# Altium schematic symbol library JL_SCH.SchLib: 1185 symbols (part 3 of 6) (continued)
## Header 30X2_2 (continued)
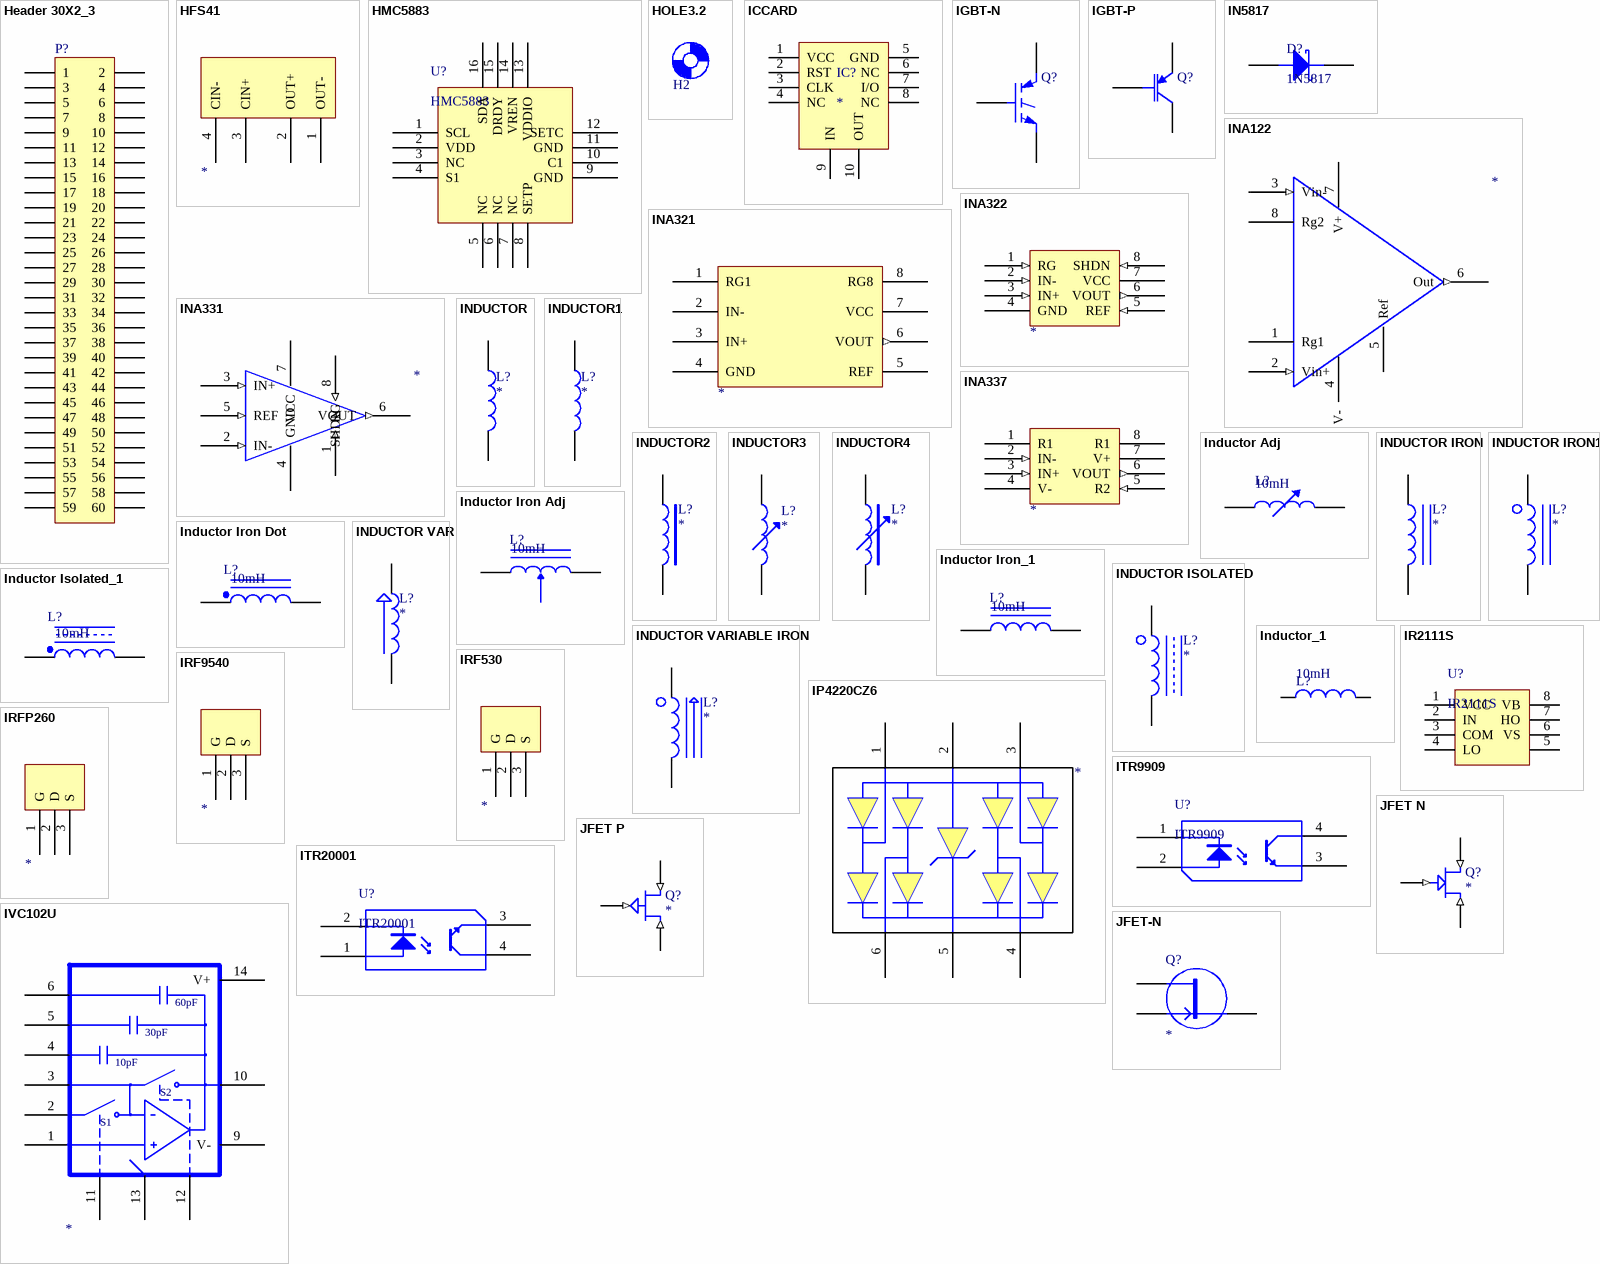
[diagram p18: symbols Header 30X2_3 to JFET-N]

## Header 30X2_3
designator P?
Header, 30-Pin, Dual row; LatestRevisionDate: 17-Jul-2002; LatestRevisionNote: Re-released for DXP Platform.; Publisher: Altium Limited
footprint HDR2X30 (Connector; Header; 30x2 Position)
pins: 1, 2, 3, 4, 5, 6, 7, 8, 9, 10, 11, 12, 13, 14, 15, 16, 17, 18, 19, 20, 21, 22, 23, 24, 25, 26, 27, 28, 29, 30, 31, 32, 33, 34, 35, 36, 37, 38, 39, 40, 41, 42, 43, 44, 45, 46, 47, 48, 49, 50, 51, 52, 53, 54, 55, 56, 57, 58, 59, 60

## HFS41
designator ?
pins: 1 OUT-, 2 OUT+, 3 CIN+, 4 CIN-

## HMC5883
designator U?
footprint LPCC-16 (Footprint not found)
pins: 1 SCL, 2 VDD, 3 NC, 4 S1, 5 NC, 6 NC, 7 NC, 8 SETP, 9 GND, 10 C1, 11 GND, 12 SETC, 13 VDDIO, 14 VREN, 15 DRDY, 16 SDA

## HOLE3.2
designator H2, comment Comment  (value not drawn)
footprint HOLE3.2

## ICCARD
designator IC?
footprint ICCARD (IC?)
pins: 1 VCC, 2 RST, 3 CLK, 4 NC, 5 GND, 6 NC, 7 I/O, 8 NC, 9 IN, 10 OUT

## IGBT-N
designator Q?
Insulated Gate Bipolar Transistor (N-Channel); Published: 8-Jun-2000; LatestRevisionDate: 17-Jul-2002; LatestRevisionNote: Re-released for DXP Platform.; DatasheetVersion: PD-9.684A; PackageReference: TO-247; Publisher: Altium Limited; Code_JEDEC: TO-247-AC; ComponentLink1Description: Manufacturer Link; ComponentLink1URL: http://www.irf.com/
footprint SFM-F3/Y2.3 (SIP with Mounting Hole; 3 Leads; Body 20 x 15.6 x 5 mm (typ); Pitch 5.45 mm)
simulation model IRGPC40U (Spice Subcircuit)
pins: 1 G, 2 C, 3 E

## IGBT-P
designator Q?
PNP Bipolar Junction Transistor; Published: 8-Jun-2000; LatestRevisionDate: 17-Jul-2002; LatestRevisionNote: Re-released for DXP Platform.; PackageReference: TO-264-AA; Publisher: Altium Limited; Code_JEDEC: TO-264-AA
footprint SFM-F3/B1.5 (SIP with Mounting Hole; 3 Leads; Body 26 x 20 x 5 mm (typ); Pitch 5.45 mm)
simulation model PIGBT (Spice Subcircuit)
pins: 1 C, 2 G, 3 E

## IN5817
designator D?, comment 1N5817
footprint TO-92 (TO, Flat Index; 3 In-Line, Axial Leads; Body Dia. 5.1mm; Leads 0.48 x 0.48 mm (max))
pins: 1 A, 2 K

## INA122
designator ?
pins: 1 Rg1, 2 Vin+ (in), 3 Vin- (in), 4 V- (power), 5 Ref, 6 Out (out), 7 V+ (power), 8 Rg2

## INA321
designator ?
pins: 1 RG1, 2 IN-, 3 IN+, 4 GND (power), 5 REF, 6 VOUT (out), 7 VCC (power), 8 RG8

## INA322
designator ?
pins: 1 RG (in), 2 IN- (in), 3 IN+ (in), 4 GND (power), 5 REF (in), 6 VOUT (out), 7 VCC (power), 8 SHDN (in)

## INA331
designator ?
pins: 1 RG (in), 2 IN- (in), 3 IN+ (in), 4 GND (power), 5 REF (in), 6 VOUT (out), 7 VCC (power), 8 SHDN (in)

## INA337
designator ?
pins: 1 R1, 2 IN- (in), 3 IN+ (in), 4 V- (power), 5 R2 (in), 6 VOUT (out), 7 V+ (power), 8 R1

## INDUCTOR
designator L?
Value: 100uH
footprint CD75
pins: 1, 2

## INDUCTOR1
designator L?
pins: 1, 2

## INDUCTOR2
designator L?
pins: 1, 2

## INDUCTOR3
designator L?
pins: 1, 2

## INDUCTOR4
designator L?
pins: 1, 2

## Inductor Adj
designator L?  value 10mH
Adjustable Inductor; Set Position: 0.5; Published: 24-Mar-1999; LatestRevisionDate: 17-Jul-2002; LatestRevisionNote: Re-released for DXP Platform.; PackageReference: AXIAL-0.8; Publisher: Altium Limited
footprint AXIAL-0.8 (Axial Device, Thru-Hole; 2 Leads; 0.8 in Pin Spacing)
simulation model INDUCTOR (Inductor)
signal-integrity model Inductor Adj
pins: 1, 2

## INDUCTOR IRON
designator L?
pins: 1, 2

## INDUCTOR IRON1
designator L?
pins: 1, 2

## Inductor Iron Adj
designator L?  value 10mH
Adjustable Magnetic-Core Inductor; Set Position: 0.5; Published: 24-Mar-1999; LatestRevisionDate: 17-Jul-2002; LatestRevisionNote: Re-released for DXP Platform.; PackageReference: AXIAL-1.0; Publisher: Altium Limited
footprint AXIAL-1.0 (Axial Device, Thru-Hole; 2 Leads; 1.0 in Pin Spacing)
simulation model INDUCTOR (Inductor)
signal-integrity model Inductor Iron Adj
pins: 1, 2

## Inductor Iron Dot
designator L?  value 10mH
Magnetic-Core Inductor with Winding Polarity Marking; Published: 24-Mar-1999; LatestRevisionDate: 17-Jul-2002; LatestRevisionNote: Re-released for DXP Platform.; PackageReference: DIODE_SMC; Publisher: Altium Limited
footprint DIODE_SMC (Magnetic-Core Inductor with Winding Polarity Marking; 2 Leads)
signal-integrity model Inductor Iron Dot
pins: 1, 2

## Inductor Iron_1
designator L?  value 10mH
Magnetic-Core Inductor; Published: 24-Mar-1999; LatestRevisionDate: 17-Jul-2002; LatestRevisionNote: Re-released for DXP Platform.; PackageReference: AXIAL-0.9; Publisher: Altium Limited
footprint AXIAL-0.9 (Axial Device, Thru-Hole; 2 Leads; 0.9 in Pin Spacing)
simulation model INDUCTOR (Inductor)
signal-integrity model Inductor Iron
pins: 1, 2

## INDUCTOR ISOLATED
designator L?
pins: 1, 2

## Inductor Isolated_1
designator L?  value 10mH
Isolated Inductor; Published: 24-Mar-1999; LatestRevisionDate: 17-Jul-2002; LatestRevisionNote: Re-released for DXP Platform.; PackageVersion: 1988; PackageReference: 425; Publisher: Altium Limited
footprint SOD123/X.85 (SOD-123; 2 Leads; Body 2.7 x 1.6 mm, (LxW))
signal-integrity model Inductor Isolated
pins: 1, 2

## INDUCTOR VAR
designator L?
pins: 1, 2

## INDUCTOR VARIABLE IRON
designator L?
pins: 1, 2

## Inductor_1
designator L?  value 10mH
Inductor; Code_IEC: 1005; Published: 8-Jun-2000; LatestRevisionDate: 29-May-2009; LatestRevisionNote: IPC-7351 Footprint Added.; PackageReference: 0402-A; Publisher: Altium Limited; PackageDescription: Chip Inductor; Code_JEITA: 0402
footprint INDC1005AL (Chip Inductor, Body 1.0x0.5mm, IPC High Density)
footprint INDC1608L (Chip Inductor, Body 1.6x0.8mm, IPC High Density)
footprint INDC2012L (Chip Inductor, Body 2.0x1.2mm, IPC High Density)
footprint INDC0603L (Chip Inductor, Body 0.6x0.3mm, IPC High Density)
footprint INDC3216AL (Chip Inductor, Body 3.2x1.6mm, IPC High Density)
footprint INDC4532L (Chip Inductor, Body 4.5x3.2mm, IPC High Density)
simulation model INDUCTOR (Inductor)
signal-integrity model Inductor
pins: 1, 2

## IP4220CZ6
designator ?
pins: 1 D1, 2 V-, 3 D2, 4 D3, 5 V+, 6 D4

## IR2111S
designator U?
footprint SOIC8
footprint DIP8
pins: 1 VCC, 2 IN, 3 COM, 4 LO, 5, 6 VS, 7 HO, 8 VB

## IRF530
designator ?
pins: 1 G, 2 D, 3 S

## IRF9540
designator ?
pins: 1 G, 2 D, 3 S

## IRFP260
designator ?
pins: 1 G, 2 D, 3 S

## ITR9909
designator U?
footprint ITR9909
pins: 1, 2, 3, 4

## ITR20001
designator U?
footprint ITR20001
pins: 1, 2, 3, 4

## IVC102U
designator ?
IVC102U
pins: 1, 2, 3, 4, 5 11, 6 12, 9 V-, 10, 11, 12 14, 13 17, 14 V+
text: 60pF; 30pF; 10pF; S2; S1

## JFET N
designator Q?
pins: 1 G (in), 2 D (in), 3 S (in)

## JFET P
designator Q?
pins: 1 G (in), 2 D (in), 3 S (in)

## JFET-N
designator Q?
pins: 1 D, 2 G, 3 S

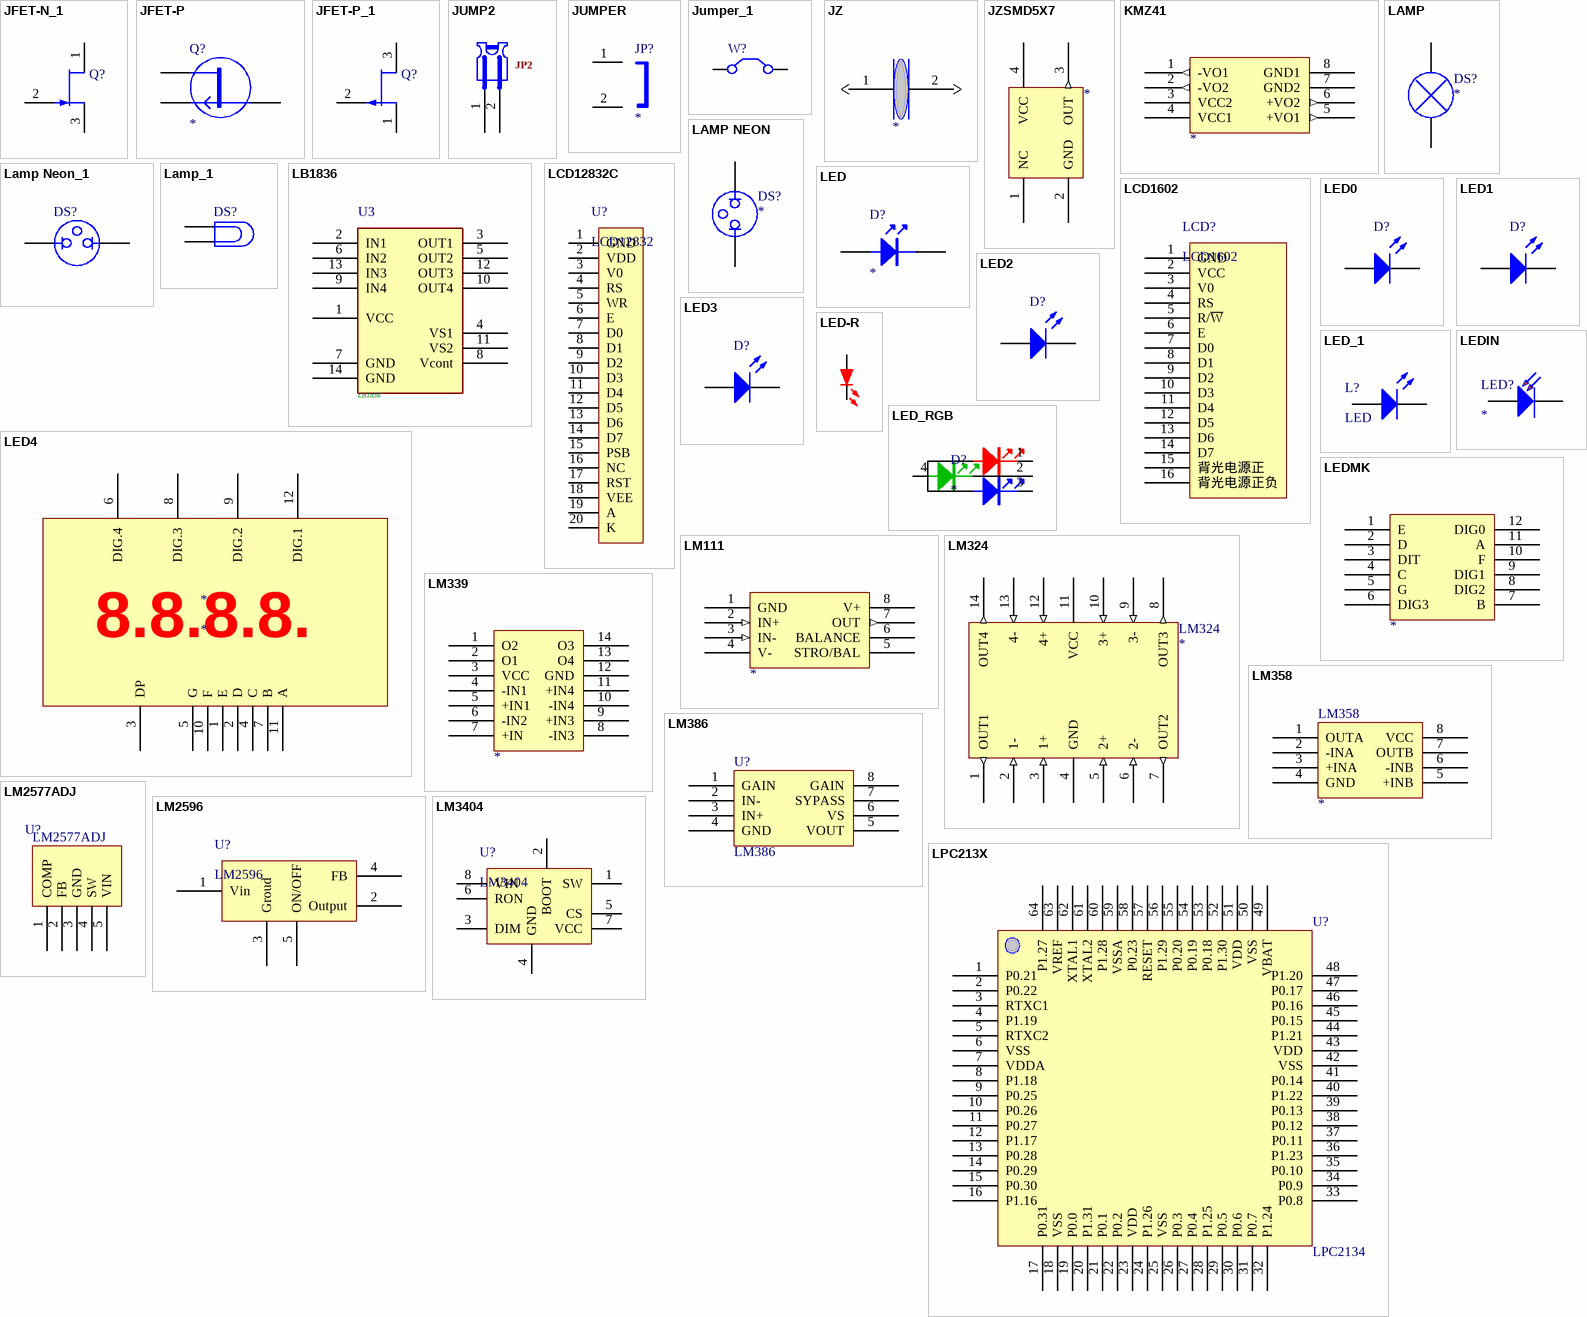
[diagram p19: symbols JFET-N_1 to LPC213X]

## JFET-N_1
designator Q?
N-Channel JFET; Published: 8-Jun-2000; LatestRevisionDate: 17-Jul-2002; LatestRevisionNote: Re-released for DXP Platform.; PackageReference: TO-254-AA; Publisher: Altium Limited; Code_JEDEC: TO-254-AA
footprint SFM-T3/A6.6V (TO, Thru-Hole, Vertical, Heatsink Mounted; 3 In-Line Leads; Pitch 3.81 mm)
simulation model NJFET
pins: 1 D, 2 G, 3 S

## JFET-P
designator Q?
pins: 1 D, 2 G, 3 S

## JFET-P_1
designator Q?
P-Channel JFET; Published: 8-Jun-2000; LatestRevisionDate: 17-Jul-2002; LatestRevisionNote: Re-released for DXP Platform.; PackageReference: TO-18A; Publisher: Altium Limited
footprint SO-F3/Y.75R (SC-89; 3 Flat Leads; Body 1.6 x 1.6 x 0.7 mm, inc leads (LxWxH typ))
simulation model PJFET
pins: 1 D, 2 G, 3 S

## JUMP2
designator JP2, comment JUMP  (value not drawn)
footprint HDR1X2 (Connector; Header; 2 Position)
pins: 1, 2

## JUMPER
designator JP?
Jumper
footprint RAD0.2
pins: 1, 2

## Jumper_1
designator W?
Jumper Wire; Published: 24-Mar-1999; LatestRevisionDate: 17-Jul-2002; LatestRevisionNote: Re-released for DXP Platform.; PackageReference: RAD-0.2; Publisher: Altium Limited
footprint RAD-0.2 (Radial Cap, Thru-Hole; 2 Leads; 0.2 in Pin Spacing)
pins: 1 C1, 2 C2

## JZ
designator ?
pins: 1 (hiz), 2 (hiz)

## JZSMD5X7
designator ?
pins: 1 NC, 2 GND (power), 3 OUT (out), 4 VCC (power)

## KMZ41
designator ?
pins: 1 -VO1 (out), 2 -VO2 (out), 3 VCC2 (power), 4 VCC1 (power), 5 +VO1 (out), 6 +VO2 (out), 7 GND2 (power), 8 GND1 (power)

## LAMP
designator DS?
pins: 1, 2

## LAMP NEON
designator DS?
pins: 1, 2

## Lamp Neon_1
designator DS?
Neon Lamp; Published: 24-Mar-1999; LatestRevisionDate: 17-Jul-2002; LatestRevisionNote: Re-released for DXP Platform.; PackageReference: PIN2; Publisher: Altium Limited
footprint PIN2 (Neon Lamp; 2 Leads)
pins: 1, 2

## Lamp_1
designator DS?
Incandescent Bulb; Published: 24-Mar-1999; LatestRevisionDate: 17-Jul-2002; LatestRevisionNote: Re-released for DXP Platform.; PackageReference: PIN2; Publisher: Altium Limited
footprint PIN2 (Incandescent Bulb; 2 Leads)
pins: 1, 2

## LB1836
designator U3
footprint SOP14-225-1.27
pins: 1 VCC, 2 IN1, 3 OUT1, 4 VS1, 5 OUT2, 6 IN2, 7 GND, 8 Vcont, 9 IN4, 10 OUT4, 11 VS2, 12 OUT3, 13 IN3, 14 GND

## LCD1602
designator LCD?
footprint LCD1602A (LCD1602A液晶显示器)
pins: 1 GND, 2 VCC, 3 V0, 4 RS, 5 R/~{W}, 6 E, 7 D0, 8 D1, 9 D2, 10 D3, 11 D4, 12 D5, 13 D6, 14 D7, 15 背光电源正, 16 背光电源正负

## LCD12832C
designator U?, comment LCD12832
footprint HDR1X20 (Connector; Header; 20 Position)
pins: 1 GND, 2 VDD, 3 V0, 4 RS, 5 WR, 6 E, 7 D0, 8 D1, 9 D2, 10 D3, 11 D4, 12 D5, 13 D6, 14 D7, 15 PSB, 16 NC, 17 RST, 18 VEE, 19 A, 20 K

## LED
designator D?
footprint 0805D
pins: 1, 2

## LED0
designator D?
Typical INFRARED GaAs LED; Published: 8-Jun-2000; LatestRevisionDate: 08-Jul-2005; LatestRevisionNote: Mech Layer 1 removed.; PackageReference: LED-0; Publisher: Altium Limited
footprint LED-0 (Typical INFRARED GaAs LED; 2 Leads)
simulation model LED0 (Diode)
pins: 1 A, 2 K

## LED1
designator D?
Typical RED GaAs LED; Published: 8-Jun-2000; LatestRevisionDate: 08-Jul-2005; LatestRevisionNote: Mech Layer 1 removed.; PackageReference: LED-1; Publisher: Altium Limited
footprint LED-1 (Typical RED GaAs LED; 2 Leads)
simulation model LED1 (Diode)
pins: 1 A, 2 K

## LED2
designator D?
Typical RED, GREEN, YELLOW, AMBER GaAs LED; Published: 8-Jun-2000; LatestRevisionDate: 17-Jul-2002; LatestRevisionNote: Re-released for DXP Platform.; PackageVersion: Feb-2002; PackageReference: 3.2X1.6X1.1; Publisher: Altium Limited
footprint DSO-F2/D6.1 (SMT LED; 2 Flat Leads)
simulation model LED2 (Diode)
pins: 1 A, 2 K

## LED3
designator D?
Typical BLUE SiC LED; Published: 8-Jun-2000; LatestRevisionDate: 17-Dec-2003; LatestRevisionNote: PCB Footprint replaced.; DatasheetVersion: 16-Apr-2002; PackageVersion: 16-Apr-2002; PackageReference: 3.5X2.8X1.9; Publisher: Altium Limited
footprint DSO-C2/D5.6 (SM LED; 2 C-Bend Leads; Body 3.5 x 2.8 x 1.9 mm, inc leads (LxWxH typ))
simulation model LED3 (Diode)
signal-integrity model LED
pins: 1 A, 2 K

## LED4
designator *
footprint LED4
pins: 1 E, 2 D, 3 DP, 4 C, 5 G, 6 DIG.4, 7 B, 8 DIG.3, 9 DIG.2, 10 F, 11 A, 12 DIG.1
text: 8.8.8.8.

## LED-R
designator LED2  (value not drawn)
footprint 0805-d
footprint 0603-d
pins: 1 A, 2 K
2 alternate drawings of the same symbol

## LED_1
designator L?, comment LED
footprint C2012 (Chip Capacitor, 2-Leads, Body 2.0x1.2mm, IPC Low Density)
pins: 1 A, 2 K

## LED_RGB
designator D?
footprint LED3528
pins: 1, 2, 3, 4

## LEDIN
designator LED?
footprint led5mm
pins: 1, 2

## LEDMK
designator ?
pins: 1 E, 2 D, 3 DIT, 4 C, 5 G, 6 DIG3, 7 B, 8 DIG2, 9 DIG1, 10 F, 11 A, 12 DIG0

## LM111
designator ?
pins: 1 GND (power), 2 IN+ (in), 3 IN- (in), 4 V- (power), 5 STRO/BAL, 6 BALANCE, 7 OUT (out), 8 V+ (power)

## LM324
designator LM324
pins: 1 OUT1 (out), 2 1- (in), 3 1+ (in), 4 GND (power), 5 2+ (in), 6 2- (in), 7 OUT2 (out), 8 OUT3 (out), 9 3- (in), 10 3+ (in), 11 VCC (power), 12 4+ (in), 13 4- (in), 14 OUT4 (out)

## LM339
designator ?
pins: 1 O2, 2 O1, 3 VCC, 4 -IN1, 5 +IN1, 6 -IN2, 7 +IN, 8 -IN3, 9 +IN3, 10 -IN4, 11 +IN4, 12 GND, 13 O4, 14 O3

## LM358
designator LM358
footprint SO-8
pins: 1 OUTA, 2 -INA, 3 +INA, 4 GND, 5 +INB, 6 -INB, 7 OUTB, 8 VCC

## LM386
designator U?
footprint so-8
pins: 1 GAIN, 2 IN-, 3 IN+, 4 GND, 5 VOUT, 6 VS, 7 SYPASS, 8 GAIN

## LM2577ADJ
designator U?
Value: LM2577ADJ
footprint TO-263 (Footprint not found)
pins: 1 COMP, 2 FB, 3 GND, 4 SW, 5 VIN

## LM2596
designator U?
footprint TO-263-5
pins: 1 Vin, 2 Output, 3 Groud, 4 FB, 5 ON/OFF

## LM3404
designator U?
footprint SO-8 (Footprint not found)
pins: 1 SW, 2 BOOT, 3 DIM, 4 GND, 5 CS, 6 RON, 7 VCC, 8 VIN

## LPC213X
designator U?, comment LPC2134
LPC2131
footprint LQFP-64
pins: 1 P0.21, 2 P0.22, 3 RTXC1, 4 P1.19, 5 RTXC2, 6 VSS, 7 VDDA, 8 P1.18, 9 P0.25, 10 P0.26, 11 P0.27, 12 P1.17, 13 P0.28, 14 P0.29, 15 P0.30, 16 P1.16, 17 P0.31, 18 VSS, 19 P0.0, 20 P1.31, 21 P0.1, 22 P0.2, 23 VDD, 24 P1.26, 25 VSS, 26 P0.3, 27 P0.4, 28 P1.25, 29 P0.5, 30 P0.6, 31 P0.7, 32 P1.24, 33 P0.8, 34 P0.9, 35 P0.10, 36 P1.23, 37 P0.11, 38 P0.12, 39 P0.13, 40 P1.22, 41 P0.14, 42 VSS, 43 VDD, 44 P1.21, 45 P0.15, 46 P0.16, 47 P0.17, 48 P1.20, 49 VBAT, 50 VSS, 51 VDD, 52 P1.30, 53 P0.18, 54 P0.19, 55 P0.20, 56 P1.29, 57 RESET, 58 P0.23, 59 VSSA, 60 P1.28, 61 XTAL2, 62 XTAL1, 63 VREF, 64 P1.27

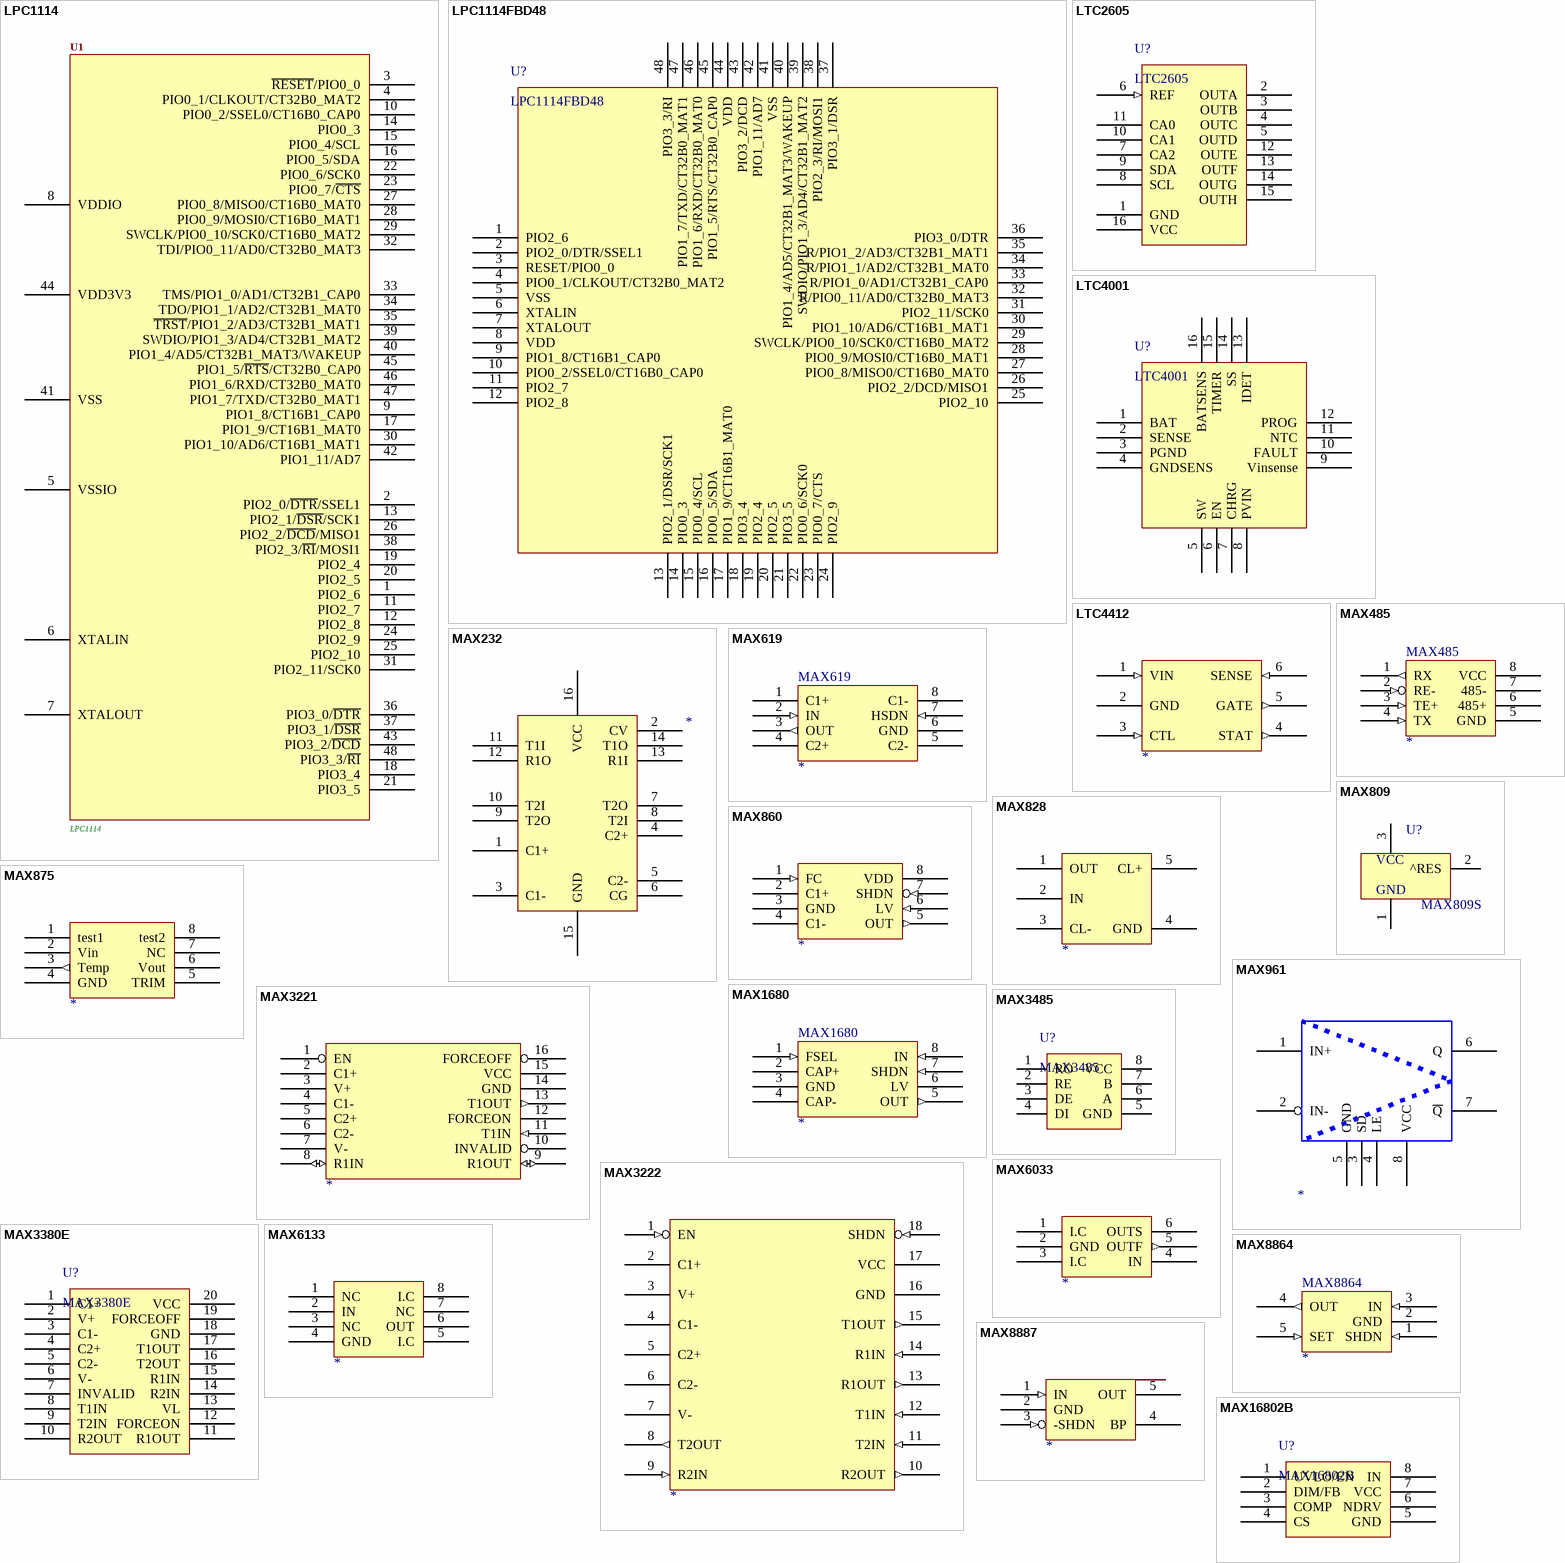
[diagram p20: symbols LPC1114 to MAX16802B]

## LPC1114
designator U1
footprint LQFP-48
pins: 1 PIO2_6, 2 PIO2_0/~{DTR}/SSEL1, 3 ~{RESET}/PIO0_0, 4 PIO0_1/CLKOUT/CT32B0_MAT2, 5 VSSIO, 6 XTALIN, 7 XTALOUT, 8 VDDIO, 9 PIO1_8/CT16B1_CAP0, 10 PIO0_2/SSEL0/CT16B0_CAP0, 11 PIO2_7, 12 PIO2_8, 13 PIO2_1/~{DSR}/SCK1, 14 PIO0_3, 15 PIO0_4/SCL, 16 PIO0_5/SDA, 17 PIO1_9/CT16B1_MAT0, 18 PIO3_4, 19 PIO2_4, 20 PIO2_5, 21 PIO3_5, 22 PIO0_6/SCK0, 23 PIO0_7/~{CTS}, 24 PIO2_9, 25 PIO2_10, 26 PIO2_2/~{DCD}/MISO1, 27 PIO0_8/MISO0/CT16B0_MAT0, 28 PIO0_9/MOSI0/CT16B0_MAT1, 29 SWCLK/PIO0_10/SCK0/CT16B0_MAT2, 30 PIO1_10/AD6/CT16B1_MAT1, 31 PIO2_11/SCK0, 32 TDI/PIO0_11/AD0/CT32B0_MAT3, 33 TMS/PIO1_0/AD1/CT32B1_CAP0, 34 TDO/PIO1_1/AD2/CT32B1_MAT0, 35 ~{TRST}/PIO1_2/AD3/CT32B1_MAT1, 36 PIO3_0/~{DTR}, 37 PIO3_1/~{DSR}, 38 PIO2_3/~{RI}/MOSI1, 39 SWDIO/PIO1_3/AD4/CT32B1_MAT2, 40 PIO1_4/AD5/CT32B1_MAT3/WAKEUP, 41 VSS, 42 PIO1_11/AD7, 43 PIO3_2/~{DCD}, 44 VDD3V3, 45 PIO1_5/~{RTS}/CT32B0_CAP0, 46 PIO1_6/RXD/CT32B0_MAT0, 47 PIO1_7/TXD/CT32B0_MAT1, 48 PIO3_3/~{RI}

## LPC1114FBD48
designator U?
footprint LQFP48
pins: 1 PIO2_6, 2 PIO2_0/DTR/SSEL1, 3 RESET/PIO0_0, 4 PIO0_1/CLKOUT/CT32B0_MAT2, 5 VSS, 6 XTALIN, 7 XTALOUT, 8 VDD, 9 PIO1_8/CT16B1_CAP0, 10 PIO0_2/SSEL0/CT16B0_CAP0, 11 PIO2_7, 12 PIO2_8, 13 PIO2_1/DSR/SCK1, 14 PIO0_3, 15 PIO0_4/SCL, 16 PIO0_5/SDA, 17 PIO1_9/CT16B1_MAT0, 18 PIO3_4, 19 PIO2_4, 20 PIO2_5, 21 PIO3_5, 22 PIO0_6/SCK0, 23 PIO0_7/CTS, 24 PIO2_9, 25 PIO2_10, 26 PIO2_2/DCD/MISO1, 27 PIO0_8/MISO0/CT16B0_MAT0, 28 PIO0_9/MOSI0/CT16B0_MAT1, 29 SWCLK/PIO0_10/SCK0/CT16B0_MAT2, 30 PIO1_10/AD6/CT16B1_MAT1, 31 PIO2_11/SCK0, 32 R/PIO0_11/AD0/CT32B0_MAT3, 33 R/PIO1_0/AD1/CT32B1_CAP0, 34 R/PIO1_1/AD2/CT32B1_MAT0, 35 R/PIO1_2/AD3/CT32B1_MAT1, 36 PIO3_0/DTR, 37 PIO3_1/DSR, 38 PIO2_3/RI/MOSI1, 39 SWDIO/PIO1_3/AD4/CT32B1_MAT2, 40 PIO1_4/AD5/CT32B1_MAT3/WAKEUP, 41 VSS, 42 PIO1_11/AD7, 43 PIO3_2/DCD, 44 VDD, 45 PIO1_5/RTS/CT32B0_CAP0, 46 PIO1_6/RXD/CT32B0_MAT0, 47 PIO1_7/TXD/CT32B0_MAT1, 48 PIO3_3/RI

## LTC2605
designator U?
footprint SSOP-16
footprint SSOP16
pins: 1 GND (power), 2 OUTA (power), 3 OUTB (power), 4 OUTC (power), 5 OUTD (power), 6 REF (in), 7 CA2 (oc), 8 SCL (oc), 9 SDA (oc), 10 CA1 (oc), 11 CA0 (oc), 12 OUTE (oc), 13 OUTF (oc), 14 OUTG (oc), 15 OUTH (oc), 16 VCC (power)

## LTC4001
designator U?
footprint QFN-16
pins: 1 BAT, 2 SENSE, 3 PGND, 4 GNDSENS, 5 SW, 6 EN, 7 CHRG, 8 PVIN, 9 Vinsense, 10 FAULT, 11 NTC, 12 PROG, 13 IDET, 14 SS, 15 TIMER, 16 BATSENS

## LTC4412
designator ?
pins: 1 VIN (in), 2 GND (power), 3 CTL (in), 4 STAT (out), 5 GATE (out), 6 SENSE (in)

## MAX232
designator ?
pins: 1 C1+, 2 CV, 3 C1-, 4 C2+, 5 C2-, 6 CG, 7 T2O, 8 T2I, 9 T2O, 10 T2I, 11 T1I, 12 R1O, 13 R1I, 14 T1O, 15 GND, 16 VCC